# Altium footprint library My Library.PcbLib: 872 footprints (part 46 of 55)
Each footprint in its own frame and in the unit in brackets; x right, y up, seen from the top. Pads: shape width x height; smd on the part's side, far side on the other; paste and mask are expansions set on the pad; w line width, h text height; cw(c..) or ccw(c..) is an arc to the next point about the centre after c.
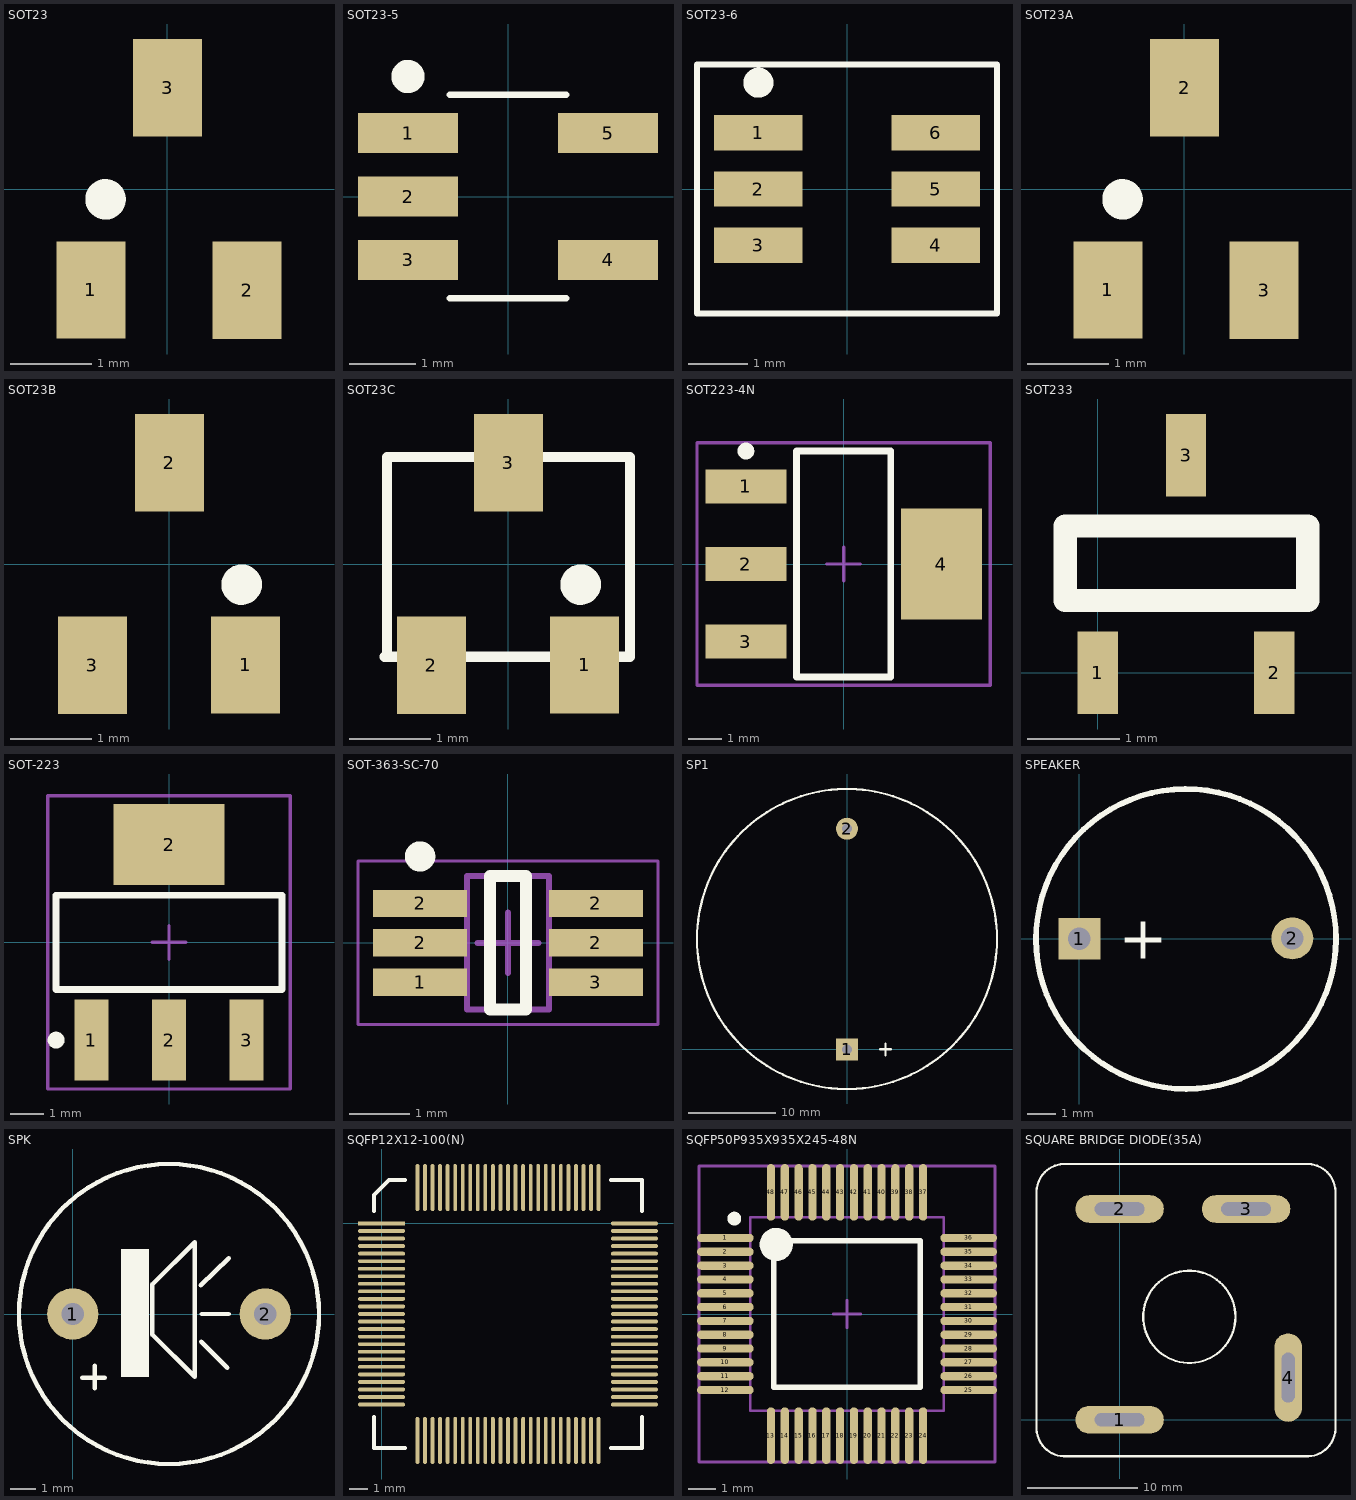
[diagram p45: the footprints below, top view; thin cyan lines are the x and y axes]

## SOT23 [mm] "SOT 23 _ 1-3-2"
height 1.27
pads (3):
  rect 0.85x1.2 smd: 1(-0.94,-1.245) 2(0.985,-1.25) 3(0.005,1.25)
Top Overlay:
  circle w0.25: c-0.76,-0.127 r0.125
3D body "SW3DPS-SOT-23-DEFAULT.STEP": height 1.06, standoff -0.04, extent -1.475,-1.326 1.525,1.174

## SOT23-5 [mm] "SOT23, 5-Leads, Body 3.0x3.0mm (max), Pitch 0.95mm, IPC Medium Density"
height 1.45
pads (5):
  rect 1.5x0.6 smd: 1(-1.5,0.95) 2(-1.5,0) 3(-1.5,-0.95) 4(1.5,-0.95) 5(1.5,0.95)
Top Overlay:
  circle w0.25: c-1.5,1.8 r0.125
  lines w0.1: -0.875,-1.525 0.875,-1.525 ; -0.875,1.525 0.875,1.525
3D body: height 0.15, standoff 0, extent -1.753,0.711 -1.219,1.168
3D body: height 0.9, standoff 0, extent -1.219,0.711 -1.092,1.168
3D body: height 0.9, standoff 0.75, extent -1.092,0.711 -0.813,1.168
3D body: height 1.45, standoff 0, extent -0.875,-1.525 0.875,1.525
3D body: height 0.9, standoff 0.75, extent -1.092,-0.239 -0.813,0.218
3D body: height 0.9, standoff 0, extent -1.219,-0.239 -1.092,0.218
3D body: height 0.15, standoff 0, extent -1.753,-0.239 -1.219,0.218
3D body: height 0.9, standoff 0.75, extent -1.092,-1.189 -0.813,-0.732
3D body: height 0.9, standoff 0, extent -1.219,-1.189 -1.092,-0.732
3D body: height 0.15, standoff 0, extent -1.753,-1.189 -1.219,-0.732
3D body: height 0.9, standoff 0.75, extent 0.813,0.732 1.092,1.189
3D body: height 0.9, standoff 0, extent 1.092,0.732 1.219,1.189
3D body: height 0.15, standoff 0, extent 1.219,0.732 1.753,1.189
3D body: height 0.9, standoff 0.75, extent 0.813,-1.168 1.092,-0.711
3D body: height 0.9, standoff 0, extent 1.092,-1.168 1.219,-0.711
3D body: height 0.15, standoff 0, extent 1.219,-1.168 1.753,-0.711

## SOT23-6 [mm] "SOT23, 5-Leads, Body 3.0x3.0mm (max), Pitch 0.95mm, IPC Medium Density"
height 1.45
pads (6):
  rect 1.5x0.6 smd: 1(-1.5,0.95) 2(-1.5,0) 3(-1.5,-0.95) 4(1.5,-0.95) 5(1.5,0) 6(1.5,0.95)
Top Overlay:
  circle w0.25: c-1.5,1.8 r0.125
  circle w0.254: c-1.5,1.8 r0.127
  lines w0.102: -2.159,2.107 1.905,2.107 ; -2.54,-2.107 2.54,-2.107 2.54,2.107 -2.54,2.107 -2.54,-2.107
3D body: height 0.15, standoff 0, extent 1.219,-0.218 1.753,0.239
3D body: height 0.9, standoff 0, extent 1.092,-0.218 1.219,0.239
3D body: height 0.9, standoff 0.75, extent 0.813,-0.218 1.092,0.239
3D body: height 0.15, standoff 0, extent -1.753,0.711 -1.219,1.168
3D body: height 0.9, standoff 0, extent -1.219,0.711 -1.092,1.168
3D body: height 0.9, standoff 0.75, extent -1.092,0.711 -0.813,1.168
3D body: height 1.45, standoff 0, extent -0.875,-1.525 0.875,1.525
3D body: height 0.9, standoff 0.75, extent -1.092,-0.239 -0.813,0.218
3D body: height 0.9, standoff 0, extent -1.219,-0.239 -1.092,0.218
3D body: height 0.15, standoff 0, extent -1.753,-0.239 -1.219,0.218
3D body: height 0.9, standoff 0.75, extent -1.092,-1.189 -0.813,-0.732
3D body: height 0.9, standoff 0, extent -1.219,-1.189 -1.092,-0.732
3D body: height 0.15, standoff 0, extent -1.753,-1.189 -1.219,-0.732
3D body: height 0.9, standoff 0.75, extent 0.813,0.732 1.092,1.189
3D body: height 0.9, standoff 0, extent 1.092,0.732 1.219,1.189
3D body: height 0.15, standoff 0, extent 1.219,0.732 1.753,1.189
3D body: height 0.9, standoff 0.75, extent 0.813,-1.168 1.092,-0.711
3D body: height 0.9, standoff 0, extent 1.092,-1.168 1.219,-0.711
3D body: height 0.15, standoff 0, extent 1.219,-1.168 1.753,-0.711

## SOT23A [mm] "SOT 23A"
height 1.27
pads (3):
  rect 0.85x1.2 smd: 1(-0.94,-1.245) 2(0.005,1.25) 3(0.985,-1.25)
Top Overlay:
  circle w0.25: c-0.76,-0.127 r0.125
3D body "SW3DPS-SOT-23-DEFAULT.STEP": height 1.06, standoff -0.04, extent -1.5,-1.301 1.5,1.199

## SOT23B [mm] "SOT 23B"
height 1.27
pads (3):
  rect 0.85x1.2 smd: 1(0.94,-1.245) 2(0,1.25) 3(-0.95,-1.25)
Top Overlay:
  circle w0.25: c0.891,-0.254 r0.125
3D body "SW3DPS-SOT-23-DEFAULT.STEP": height 1.06, standoff -0.04, extent -1.5,-1.301 1.5,1.199

## SOT23C [mm] "SOT 23C - 2-3-1 - BCE"
height 1.27
pads (3):
  rect 0.85x1.2 smd: 1(0.94,-1.245) 2(-0.95,-1.25) 3(0,1.25)
Top Overlay:
  circle w0.25: c0.891,-0.254 r0.125
  lines w0.127: -1.524,-1.143 -1.499,-1.143 -1.499,1.321 1.499,1.321 1.499,-1.143 -1.524,-1.143
3D body "SW3DPS-SOT-23-DEFAULT.STEP": height 1.06, standoff -0.04, extent -1.5,-1.174 1.5,1.326

## SOT223-4N [mm] "SOT223, 4-Leads, Body 6.5x3.5mm, Pitch 2.3mm, Lead Span 7mm, IPC Medium Density"
height 1.8
pads (4):
  rect 2.4x1 smd: 1(-2.9,2.3) 2(-2.9,0) 3(-2.9,-2.3)
  rect 2.4x3.3 smd: 4(2.9,0)
Top Overlay:
  circle w0.25: c-2.9,3.35 r0.125
  lines w0.2: -1.4,-3.35 -1.4,3.35 1.4,3.35 1.4,-3.35 -1.4,-3.35
Mechanical 15:
  lines w0.1: -0.5,0 0.5,0 ; 0,-0.5 0,0.5 ; -4.35,-3.6 -4.35,3.6 4.35,3.6 4.35,-3.6 -4.35,-3.6
3D body "SW3dPS-Regulator.STEP": height 1.72, standoff 0.02, extent -3.395,-3.274 3.496,3.226

## SOT233 [mm]
pads (3):
  rect 0.44x0.9 smd: 1(0,0) 2(1.92,0) 3(0.96,2.37)
Top Overlay:
  lines w0.254: -0.356,0.787 2.286,0.787 2.286,1.6 -0.356,1.6 -0.356,0.787
3D body "User Library-3-lead sot23-3.step": height 1.04, standoff 0.02, extent -0.495,-0.051 2.425,2.425

## SOT-223 [mm] "SOT223, 4-Leads, Body 6.5x3.5mm, Pitch 2.3mm, Lead Span 7mm, IPC Medium Density"
height 1.8
pads (4):
  rect 1x2.4 smd: 1(-2.3,-2.9) 2(0,-2.9) 3(2.3,-2.9)
  rect 3.3x2.4 smd: 2(0,2.9)
Top Overlay:
  circle w0.25: c-3.35,-2.9 r0.125
  lines w0.2: -3.35,-1.4 -3.35,1.4 3.35,1.4 3.35,-1.4 -3.35,-1.4
Mechanical 15:
  lines w0.1: -0.5,0 0.5,0 ; 0,-0.5 0,0.5 ; -3.6,-4.35 -3.6,4.35 3.6,4.35 3.6,-4.35 -3.6,-4.35
3D body "SW3dPS-Regulator.STEP": height 1.72, standoff 0.02, extent -3.226,-3.395 3.274,3.496

## SOT-363-SC-70 [mm] "SOT-363, 6-Leads, Body 2,00x2,13mm, Pitch 0,65mm, IPC Medium Density"
height 1
pads (6):
  rect 1.55x0.45 smd: 1(-1.45,-0.65) 2(-1.45,0) 2(-1.45,0.65) 2(1.45,0) 2(1.45,0.65) 3(1.45,-0.65)
Top Overlay:
  circle w0.25: c-1.45,1.425 r0.125
  lines w0.2: -0.3,-1.1 -0.3,1.1 0.3,1.1 0.3,-1.1 -0.3,-1.1
Mechanical 13:
  lines w0.1: -0.675,-1.1 0.675,-1.1 0.675,1.1 -0.675,1.1 -0.675,-1.1
Mechanical 15:
  lines w0.05: -2.475,-1.35 2.475,-1.35 2.475,1.35 -2.475,1.35 -2.475,-1.35
  lines w0.1: -0.5,0 0.5,0 ; 0,-0.5 0,0.5
3D body "SOT-363-SC-70.step": height 1, standoff 0.01, extent -1.218,-1.1 1.218,1.1

## SP1 [mil] "Speaker Telphone on Broad"
height 3
pads (2):
  rect 100x100 hole 45: 1(0,0)
  round 100 hole 45: 2(0,1000)
Top Overlay:
  circle w10: c0,500 r680
  lines w10: 150,0 200,0 ; 174,-28 174,26
3D body "Sonitron-SCS-32 p10-DEFAULT.STEP": height 382.53, standoff -227.75, extent -666.7,-174.54 652.2,1144.36

## SPEAKER [mm]
pads (2):
  rect 1.5x1.5 hole 0.8: 1(0,0)
  round 1.5 hole 0.8: 2(7.62,0.013)
Top Overlay:
  lines w0.203: 7.724,3.67 ccw(c3.816,-0.008) 7.76,3.632
  text "+" at 1.41,-0.711 h1.52
3D body "User Library-Buzzer WST-1203UX.step": height 4.5, standoff -9.65, extent -2.215,-6 13.239,6

## SPK [mil] "Speaker Chip"
height 500
pads (2):
  round 80 hole 35: 1(0,0) 2(300,0)
Top Overlay:
  circle w7: c150,0 r233.73
  rectangle: 75,-98 119,101
  lines w7: 15,-99 50,-99 ; 34,-116 34,-81 ; 199.52,44.52 243,87 ; 200,-43 241,-84 ; 201,0 243,0 ; 124,-32 124,46 190,112 190,-98 124,-32
3D body "Sonitron-SCS-17 P10-DEFAULT.STEP": height 343.51, standoff -267.12, extent -221,-354.14 511.28,378.14

## SQFP12X12-100(N) [mm]
pads (100):
  rect 2.5x0.2 smd: 1(0,0)
  oval 2.5x0.2 smd: 2(0,-0.4) 3(0,-0.8) 4(0,-1.2) 5(0,-1.6) 6(0,-2) 7(0,-2.4) 8(0,-2.8) 9(0,-3.2) 10(0,-3.6) 11(0,-4) 12(0,-4.4) 13(0,-4.8) 14(0,-5.2) 15(0,-5.6) 16(0,-6) 17(0,-6.4) 18(0,-6.8) 19(0,-7.2) 20(0,-7.6) 21(0,-8) 22(0,-8.4) 23(0,-8.8) 24(0,-9.2) 25(0,-9.6) 51(13.4,-9.6) 52(13.4,-9.2) 53(13.4,-8.8) 54(13.4,-8.4) 55(13.4,-8) 56(13.4,-7.6) 57(13.4,-7.2) 58(13.4,-6.8) 59(13.4,-6.4) 60(13.4,-6) 61(13.4,-5.6) 62(13.4,-5.2) 63(13.4,-4.8) 64(13.4,-4.4) 65(13.4,-4) 66(13.4,-3.6) 67(13.4,-3.2) 68(13.4,-2.8) 69(13.4,-2.4) 70(13.4,-2) 71(13.4,-1.6) 72(13.4,-1.2) 73(13.4,-0.8) 74(13.4,-0.4) 75(13.4,0)
  oval 0.2x2.5 smd: 26(1.9,-11.5) 27(2.3,-11.5) 28(2.7,-11.5) 29(3.1,-11.5) 30(3.5,-11.5) 31(3.9,-11.5) 32(4.3,-11.5) 33(4.7,-11.5) 34(5.1,-11.5) 35(5.5,-11.5) 36(5.9,-11.5) 37(6.3,-11.5) 38(6.7,-11.5) 39(7.1,-11.5) 40(7.5,-11.5) 41(7.9,-11.5) 42(8.3,-11.5) 43(8.7,-11.5) 44(9.1,-11.5) 45(9.5,-11.5) 46(9.9,-11.5) 47(10.3,-11.5) 48(10.7,-11.5) 49(11.1,-11.5) 50(11.5,-11.5) 76(11.5,1.9) 77(11.1,1.9) 78(10.7,1.9) 79(10.3,1.9) 80(9.9,1.9) 81(9.5,1.9) 82(9.1,1.9) 83(8.7,1.9) 84(8.3,1.9) 85(7.9,1.9) 86(7.5,1.9) 87(7.1,1.9) 88(6.7,1.9) 89(6.3,1.9) 90(5.9,1.9) 91(5.5,1.9) 92(5.1,1.9) 93(4.7,1.9) 94(4.3,1.9) 95(3.9,1.9) 96(3.5,1.9) 97(3.1,1.9) 98(2.7,1.9) 99(2.3,1.9) 100(1.9,1.9)
Top Overlay:
  lines w0.2: -0.4,-10.25 -0.4,-11.9 1.25,-11.9 ; -0.4,0.65 -0.4,1.5 0.4,2.3 1.25,2.3 ; 12.15,-11.9 13.8,-11.9 13.8,-10.25 ; 12.15,2.3 13.8,2.3 13.8,0.65

## SQFP50P935X935X245-48N [mm] "SQFP, 48-Leads, Body 9,5x9,5mm (max), Pitch 0,50mm, IPC Medium Density"
height 2.45
pads (48):
  oval 2.05x0.3 smd: 1(-4.4,2.75) 2(-4.4,2.25) 3(-4.4,1.75) 4(-4.4,1.25) 5(-4.4,0.75) 6(-4.4,0.25) 7(-4.4,-0.25) 8(-4.4,-0.75) 9(-4.4,-1.25) 10(-4.4,-1.75) 11(-4.4,-2.25) 12(-4.4,-2.75) 25(4.4,-2.75) 26(4.4,-2.25) 27(4.4,-1.75) 28(4.4,-1.25) 29(4.4,-0.75) 30(4.4,-0.25) 31(4.4,0.25) 32(4.4,0.75) 33(4.4,1.25) 34(4.4,1.75) 35(4.4,2.25) 36(4.4,2.75)
  oval 0.3x2.05 smd: 13(-2.75,-4.4) 14(-2.25,-4.4) 15(-1.75,-4.4) 16(-1.25,-4.4) 17(-0.75,-4.4) 18(-0.25,-4.4) 19(0.25,-4.4) 20(0.75,-4.4) 21(1.25,-4.4) 22(1.75,-4.4) 23(2.25,-4.4) 24(2.75,-4.4) 37(2.75,4.4) 38(2.25,4.4) 39(1.75,4.4) 40(1.25,4.4) 41(0.75,4.4) 42(0.25,4.4) 43(-0.25,4.4) 44(-0.75,4.4) 45(-1.25,4.4) 46(-1.75,4.4) 47(-2.25,4.4) 48(-2.75,4.4)
Top Overlay:
  circle w0.25: c-4.075,3.45 r0.125
  circle w0.6: c-2.561,2.515 r0.3
  lines w0.2: -2.65,-2.65 -2.65,2.65 2.65,2.65 2.65,-2.65 -2.65,-2.65
Mechanical 13:
  circle w0.1: c-2.55,2.55 r0.5
  lines w0.1: -3.5,-3.5 -3.5,3.5 3.5,3.5 3.5,-3.5 -3.5,-3.5
Mechanical 15:
  lines w0.1: -0.5,0 0.5,0 ; 0,-0.5 0,0.5 ; -5.35,-5.35 -5.35,5.35 5.35,5.35 5.35,-5.35 -5.35,-5.35
3D body: height 2.45, standoff 0.25, extent -3.5,-3.5 3.5,3.5
3D body: height 0.15, standoff 0, extent -4.756,2.61 -4.044,2.89
3D body: height 1.25, standoff 1.1, extent -4.166,2.61 -3.454,2.89
3D body: height 1.25, standoff 0, extent -4.166,2.61 -4.044,2.89
3D body: height 1.25, standoff 0, extent -4.166,2.11 -4.044,2.39
3D body: height 1.25, standoff 1.1, extent -4.166,2.11 -3.454,2.39
3D body: height 0.15, standoff 0, extent -4.756,2.11 -4.044,2.39
3D body: height 1.25, standoff 0, extent -4.166,1.61 -4.044,1.89
3D body: height 1.25, standoff 1.1, extent -4.166,1.61 -3.454,1.89
3D body: height 0.15, standoff 0, extent -4.756,1.61 -4.044,1.89
3D body: height 0.15, standoff 0, extent -4.756,0.11 -4.044,0.39
3D body: height 1.25, standoff 1.1, extent -4.166,0.11 -3.454,0.39
3D body: height 1.25, standoff 0, extent -4.166,0.11 -4.044,0.39
3D body: height 0.15, standoff 0, extent -4.756,0.61 -4.044,0.89
3D body: height 1.25, standoff 1.1, extent -4.166,0.61 -3.454,0.89
3D body: height 1.25, standoff 0, extent -4.166,0.61 -4.044,0.89
3D body: height 1.25, standoff 0, extent -4.166,1.11 -4.044,1.39
3D body: height 1.25, standoff 1.1, extent -4.166,1.11 -3.454,1.39
3D body: height 0.15, standoff 0, extent -4.756,1.11 -4.044,1.39
3D body: height 0.15, standoff 0, extent -4.756,-1.39 -4.044,-1.11
3D body: height 1.25, standoff 1.1, extent -4.166,-1.39 -3.454,-1.11
3D body: height 1.25, standoff 0, extent -4.166,-1.39 -4.044,-1.11
3D body: height 0.15, standoff 0, extent -4.756,-0.89 -4.044,-0.61
3D body: height 1.25, standoff 1.1, extent -4.166,-0.89 -3.454,-0.61
3D body: height 1.25, standoff 0, extent -4.166,-0.89 -4.044,-0.61
3D body: height 1.25, standoff 0, extent -4.166,-0.39 -4.044,-0.11
3D body: height 1.25, standoff 1.1, extent -4.166,-0.39 -3.454,-0.11
3D body: height 0.15, standoff 0, extent -4.756,-0.39 -4.044,-0.11
3D body: height 0.15, standoff 0, extent -4.756,-2.89 -4.044,-2.61
3D body: height 1.25, standoff 1.1, extent -4.166,-2.89 -3.454,-2.61
3D body: height 1.25, standoff 0, extent -4.166,-2.89 -4.044,-2.61
3D body: height 0.15, standoff 0, extent -4.756,-2.39 -4.044,-2.11
3D body: height 1.25, standoff 1.1, extent -4.166,-2.39 -3.454,-2.11
3D body: height 1.25, standoff 0, extent -4.166,-2.39 -4.044,-2.11
3D body: height 1.25, standoff 0, extent -4.166,-1.89 -4.044,-1.61
3D body: height 1.25, standoff 1.1, extent -4.166,-1.89 -3.454,-1.61
3D body: height 0.15, standoff 0, extent -4.756,-1.89 -4.044,-1.61
3D body: height 0.15, standoff 0, extent 1.61,-4.756 1.89,-4.044
3D body: height 1.25, standoff 1.1, extent 1.61,-4.166 1.89,-3.454
3D body: height 1.25, standoff 0, extent 1.61,-4.166 1.89,-4.044
3D body: height 1.25, standoff 0, extent 2.11,-4.166 2.39,-4.044
3D body: height 1.25, standoff 1.1, extent 2.11,-4.166 2.39,-3.454
3D body: height 0.15, standoff 0, extent 2.11,-4.756 2.39,-4.044
3D body: height 1.25, standoff 0, extent 2.61,-4.166 2.89,-4.044
3D body: height 1.25, standoff 1.1, extent 2.61,-4.166 2.89,-3.454
3D body: height 0.15, standoff 0, extent 2.61,-4.756 2.89,-4.044
3D body: height 0.15, standoff 0, extent 0.11,-4.756 0.39,-4.044
3D body: height 1.25, standoff 1.1, extent 0.11,-4.166 0.39,-3.454
3D body: height 1.25, standoff 0, extent 0.11,-4.166 0.39,-4.044
3D body: height 1.25, standoff 0, extent 0.61,-4.166 0.89,-4.044
3D body: height 1.25, standoff 1.1, extent 0.61,-4.166 0.89,-3.454
3D body: height 0.15, standoff 0, extent 0.61,-4.756 0.89,-4.044
3D body: height 1.25, standoff 0, extent 1.11,-4.166 1.39,-4.044
3D body: height 1.25, standoff 1.1, extent 1.11,-4.166 1.39,-3.454
3D body: height 0.15, standoff 0, extent 1.11,-4.756 1.39,-4.044
3D body: height 0.15, standoff 0, extent -1.39,-4.756 -1.11,-4.044
3D body: height 1.25, standoff 1.1, extent -1.39,-4.166 -1.11,-3.454
3D body: height 1.25, standoff 0, extent -1.39,-4.166 -1.11,-4.044
3D body: height 1.25, standoff 0, extent -0.89,-4.166 -0.61,-4.044
3D body: height 1.25, standoff 1.1, extent -0.89,-4.166 -0.61,-3.454
3D body: height 0.15, standoff 0, extent -0.89,-4.756 -0.61,-4.044
3D body: height 1.25, standoff 0, extent -0.39,-4.166 -0.11,-4.044
3D body: height 1.25, standoff 1.1, extent -0.39,-4.166 -0.11,-3.454
3D body: height 0.15, standoff 0, extent -0.39,-4.756 -0.11,-4.044
3D body: height 0.15, standoff 0, extent -1.89,-4.756 -1.61,-4.044
3D body: height 1.25, standoff 1.1, extent -1.89,-4.166 -1.61,-3.454
3D body: height 1.25, standoff 0, extent -1.89,-4.166 -1.61,-4.044
3D body: height 0.15, standoff 0, extent -2.39,-4.756 -2.11,-4.044
3D body: height 1.25, standoff 1.1, extent -2.39,-4.166 -2.11,-3.454
3D body: height 1.25, standoff 0, extent -2.39,-4.166 -2.11,-4.044
3D body: height 1.25, standoff 0, extent -2.89,-4.166 -2.61,-4.044
3D body: height 1.25, standoff 1.1, extent -2.89,-4.166 -2.61,-3.454
3D body: height 0.15, standoff 0, extent -2.89,-4.756 -2.61,-4.044
3D body: height 0.15, standoff 0, extent 4.07,1.61 4.781,1.89
3D body: height 1.25, standoff 1.1, extent 3.48,1.61 4.191,1.89
3D body: height 1.25, standoff 0, extent 4.07,1.61 4.191,1.89
3D body: height 1.25, standoff 0, extent 4.07,2.11 4.191,2.39
3D body: height 1.25, standoff 1.1, extent 3.48,2.11 4.191,2.39
3D body: height 0.15, standoff 0, extent 4.07,2.11 4.781,2.39
3D body: height 1.25, standoff 0, extent 4.07,2.61 4.191,2.89
3D body: height 1.25, standoff 1.1, extent 3.48,2.61 4.191,2.89
3D body: height 0.15, standoff 0, extent 4.07,2.61 4.781,2.89
3D body: height 0.15, standoff 0, extent 4.07,0.11 4.781,0.39
3D body: height 1.25, standoff 1.1, extent 3.48,0.11 4.191,0.39
3D body: height 1.25, standoff 0, extent 4.07,0.11 4.191,0.39
3D body: height 1.25, standoff 0, extent 4.07,0.61 4.191,0.89
3D body: height 1.25, standoff 1.1, extent 3.48,0.61 4.191,0.89
3D body: height 0.15, standoff 0, extent 4.07,0.61 4.781,0.89
3D body: height 1.25, standoff 0, extent 4.07,1.11 4.191,1.39
3D body: height 1.25, standoff 1.1, extent 3.48,1.11 4.191,1.39
3D body: height 0.15, standoff 0, extent 4.07,1.11 4.781,1.39
3D body: height 0.15, standoff 0, extent 4.07,-1.39 4.781,-1.11
3D body: height 1.25, standoff 1.1, extent 3.48,-1.39 4.191,-1.11
3D body: height 1.25, standoff 0, extent 4.07,-1.39 4.191,-1.11
3D body: height 1.25, standoff 0, extent 4.07,-0.89 4.191,-0.61
3D body: height 1.25, standoff 1.1, extent 3.48,-0.89 4.191,-0.61
3D body: height 0.15, standoff 0, extent 4.07,-0.89 4.781,-0.61
3D body: height 1.25, standoff 0, extent 4.07,-0.39 4.191,-0.11
3D body: height 1.25, standoff 1.1, extent 3.48,-0.39 4.191,-0.11
3D body: height 0.15, standoff 0, extent 4.07,-0.39 4.781,-0.11
3D body: height 0.15, standoff 0, extent 4.07,-1.89 4.781,-1.61
3D body: height 1.25, standoff 1.1, extent 3.48,-1.89 4.191,-1.61
3D body: height 1.25, standoff 0, extent 4.07,-1.89 4.191,-1.61
3D body: height 0.15, standoff 0, extent 4.07,-2.39 4.781,-2.11
3D body: height 1.25, standoff 1.1, extent 3.48,-2.39 4.191,-2.11
3D body: height 1.25, standoff 0, extent 4.07,-2.39 4.191,-2.11
3D body: height 1.25, standoff 0, extent 4.07,-2.89 4.191,-2.61
3D body: height 1.25, standoff 1.1, extent 3.48,-2.89 4.191,-2.61
3D body: height 0.15, standoff 0, extent 4.07,-2.89 4.781,-2.61
3D body: height 0.15, standoff 0, extent -1.896,4.09 -1.617,4.801
3D body: height 1.25, standoff 1.1, extent -1.897,3.5 -1.617,4.211
3D body: height 1.25, standoff 0, extent -1.897,4.09 -1.617,4.211
3D body: height 1.25, standoff 0, extent -2.397,4.09 -2.117,4.211
3D body: height 1.25, standoff 1.1, extent -2.397,3.5 -2.117,4.211
3D body: height 0.15, standoff 0, extent -2.396,4.09 -2.117,4.801
3D body: height 1.25, standoff 0, extent -2.897,4.09 -2.617,4.211
3D body: height 1.25, standoff 1.1, extent -2.897,3.5 -2.617,4.211
3D body: height 0.15, standoff 0, extent -2.896,4.09 -2.617,4.801
3D body: height 0.15, standoff 0, extent -0.396,4.09 -0.117,4.801
3D body: height 1.25, standoff 1.1, extent -0.397,3.5 -0.117,4.211
3D body: height 1.25, standoff 0, extent -0.397,4.09 -0.117,4.211
3D body: height 1.25, standoff 0, extent -0.897,4.09 -0.617,4.211
3D body: height 1.25, standoff 1.1, extent -0.897,3.5 -0.617,4.211
3D body: height 0.15, standoff 0, extent -0.896,4.09 -0.617,4.801
3D body: height 1.25, standoff 0, extent -1.397,4.09 -1.117,4.211
3D body: height 1.25, standoff 1.1, extent -1.397,3.5 -1.117,4.211
3D body: height 0.15, standoff 0, extent -1.396,4.09 -1.117,4.801
3D body: height 0.15, standoff 0, extent 1.104,4.09 1.383,4.801
3D body: height 1.25, standoff 1.1, extent 1.103,3.5 1.383,4.211
3D body: height 1.25, standoff 0, extent 1.103,4.09 1.383,4.211
3D body: height 1.25, standoff 0, extent 0.603,4.09 0.883,4.211
3D body: height 1.25, standoff 1.1, extent 0.603,3.5 0.883,4.211
3D body: height 0.15, standoff 0, extent 0.604,4.09 0.883,4.801
3D body: height 1.25, standoff 0, extent 0.103,4.09 0.383,4.211
3D body: height 1.25, standoff 1.1, extent 0.103,3.5 0.383,4.211
3D body: height 0.15, standoff 0, extent 0.104,4.09 0.383,4.801
3D body: height 0.15, standoff 0, extent 1.604,4.09 1.883,4.801
3D body: height 1.25, standoff 1.1, extent 1.603,3.5 1.883,4.211
3D body: height 1.25, standoff 0, extent 1.603,4.09 1.883,4.211
3D body: height 0.15, standoff 0, extent 2.104,4.09 2.383,4.801
3D body: height 1.25, standoff 1.1, extent 2.103,3.5 2.383,4.211
3D body: height 1.25, standoff 0, extent 2.103,4.09 2.383,4.211
3D body: height 1.25, standoff 0, extent 2.603,4.09 2.883,4.211
3D body: height 1.25, standoff 1.1, extent 2.603,3.5 2.883,4.211
3D body: height 0.15, standoff 0, extent 2.604,4.09 2.883,4.801

## SQUARE BRIDGE DIODE(35A) [mm]
pads (4):
  oval 8x2.5 hole 1.2 slot 4.5 at 0 deg: 1(0,0) 2(0,19.05) 3(11.43,19.05)
  oval 2.5x8 hole 1.2 slot 4.5 at 90 deg: 4(15.24,3.81)
Top Overlay:
  circle w0.2: c6.303,9.304 r4.17
  lines w0.2: -7.504,-0.6 ccw(c-4.952,-0.75) -4.802,-3.302 16.808,-3.302 ccw(c16.958,-0.75) 19.509,-0.6 19.509,20.41 ccw(c16.958,20.56) 16.808,23.111 -4.802,23.111 ccw(c-4.952,20.56) -7.504,20.41 -7.504,-0.6
3D body "User Library-SquareDiodeBridge-L.step": height 8.05, standoff -11, extent -8.281,-4.217 20.219,24.283